# Altium footprint library PCBLIB.PcbLib: 775 footprints (part 37 of 49)
Each footprint in its own frame and in the unit in brackets; x right, y up, seen from the top. Pads: shape width x height; smd on the part's side, far side on the other; paste and mask are expansions set on the pad; w line width, h text height; cw(c..) or ccw(c..) is an arc to the next point about the centre after c.
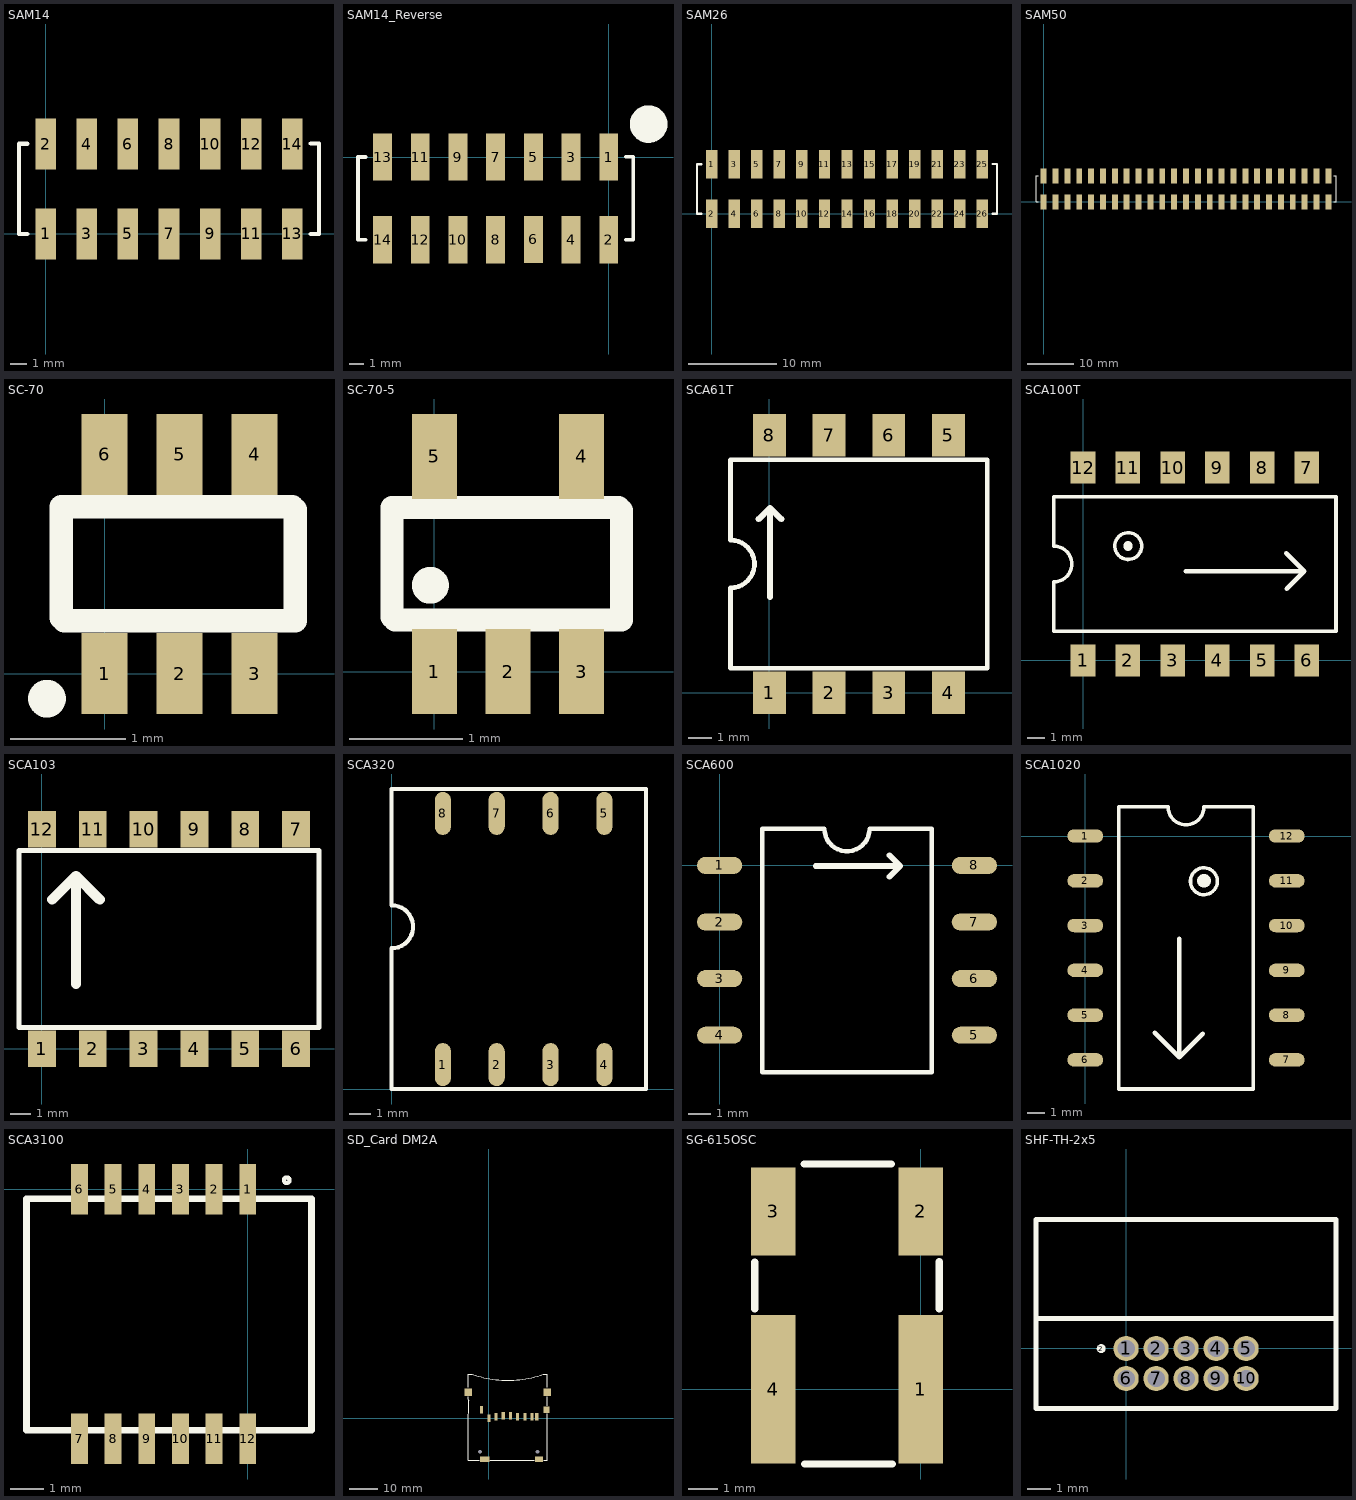
[diagram p36: the footprints below, top view; thin cyan lines are the x and y axes]

## SAM14 [mm]
pads (14):
  rect 1.27x3.17 smd: 1(0,0) 2(0,5.563) 3(2.54,0) 4(2.54,5.563) 5(5.08,0) 6(5.08,5.563) 7(7.62,0) 8(7.62,5.563) 9(10.16,0) 10(10.16,5.563) 11(12.7,0) 12(12.7,5.563) 13(15.24,0) 14(15.24,5.563)
TopOverlay:
  lines w0.254: -1.143,0 -1.651,0 -1.651,5.581 -1.143,5.581 ; 16.383,0.007 16.891,0.007 16.891,5.588 16.383,5.588
  text "." at -1.905,-1.905 h1.78

## SAM14_Reverse [mm]
pads (14):
  rect 1.27x3.17 smd: 1(0,0) 2(0,-5.563) 3(-2.54,0) 4(-2.54,-5.563) 5(-5.08,0) 6(-5.08,-5.537) 7(-7.62,0) 8(-7.62,-5.563) 9(-10.16,0) 10(-10.16,-5.563) 11(-12.7,0) 12(-12.7,-5.563) 13(-15.24,0) 14(-15.24,-5.563)
TopOverlay:
  circle w1.27: c2.684,2.229 r0.633
  lines w0.254: -16.383,-5.563 -16.891,-5.563 -16.891,0.018 -16.383,0.018 ; 1.143,-5.556 1.651,-5.556 1.651,0.025 1.143,0.025

## SAM26 [mm]
pads (26):
  rect 1.27x3.17 smd: 1(0,5.563) 2(0,0) 3(2.54,5.563) 4(2.54,0) 5(5.08,5.563) 6(5.08,0) 7(7.62,5.563) 8(7.62,0) 9(10.16,5.563) 10(10.16,0) 11(12.7,5.563) 12(12.7,0) 13(15.24,5.563) 14(15.24,0) 15(17.78,5.563) 16(17.78,0) 17(20.32,5.563) 18(20.32,0) 19(22.86,5.563) 20(22.86,0) 21(25.4,5.563) 22(25.4,0) 23(27.94,5.563) 24(27.94,0) 25(30.48,5.563) 26(30.48,0)
TopOverlay:
  lines w0.254: -1.143,0 -1.651,0 -1.651,5.581 -1.143,5.581 ; 31.623,0.007 32.131,0.007 32.131,5.588 31.623,5.588
  text "." at -0.229,7.798 h1.78

## SAM50 [mm]
pads (50):
  rect 1.27x3.17 smd: 1(0,0) 2(0,5.563) 3(2.54,0) 4(2.54,5.563) 5(5.08,0) 6(5.08,5.563) 7(7.62,0) 8(7.62,5.563) 9(10.16,0) 10(10.16,5.563) 11(12.7,0) 12(12.7,5.563) 13(15.24,0) 14(15.24,5.563) 15(17.78,0) 16(17.78,5.563) 17(20.32,0) 18(20.32,5.563) 19(22.86,0) 20(22.86,5.563) 21(25.4,0) 22(25.4,5.563) 23(27.94,0) 24(27.94,5.563) 25(30.48,0) 26(30.48,5.563) 27(33.02,0) 28(33.02,5.563) 29(35.56,0) 30(35.56,5.563) 31(38.1,0) 32(38.1,5.563) 33(40.64,0) 34(40.64,5.563) 35(43.18,0) 36(43.18,5.563) 37(45.72,0) 38(45.72,5.563) 39(48.26,0) 40(48.26,5.563) 41(50.8,0) 42(50.8,5.563) 43(53.34,0) 44(53.34,5.563) 45(55.88,0) 46(55.88,5.563) 47(58.42,0) 48(58.42,5.563) 49(60.96,0) 50(60.96,5.563)
TopOverlay:
  lines w0.254: -1.143,0 -1.651,0 -1.651,5.581 -1.143,5.581 ; 62.103,0.007 62.611,0.007 62.611,5.588 62.103,5.588
  text "." at -1.905,-1.905 h1.78

## SC-70 [mm]
pads (6):
  rect 0.4x0.7 smd: 1(0,0) 2(0.65,0) 3(1.3,0) 4(1.3,1.9) 5(0.65,1.9) 6(0,1.9)
TopOverlay:
  circle w0.254: c-0.5,-0.217 r0.036
  lines w0.203: -0.374,0.483 -0.374,1.448 1.626,1.448 ; -0.349,0.457 1.651,0.457 1.651,1.422
Mechanical4:
  text ".040" at 0,0 h0.03

## SC-70-5 [mm]
pads (5):
  rect 0.4x0.75 smd: 1(0,0) 2(0.65,0) 3(1.3,0) 4(1.3,1.9) 5(0,1.9)
TopOverlay:
  circle w0.254: c-0.036,0.762 r0.036
  lines w0.203: -0.374,0.483 -0.374,1.448 1.626,1.448 ; -0.349,0.457 1.651,0.457 1.651,1.422
Mechanical4:
  text ".040" at 0,0 h0.03

## SCA61T [mil]
height 200
pads (8):
  rect 55x71.5 smd: 1(0,0) 2(100,0) 3(200,0) 4(300,0) 5(300,431) 6(200,431) 7(100,431) 8(0,431)
TopOverlay:
  lines w8: -65,41 -65,175.5 ccw(c-65,215.5) -65,255.5 -65,390 365,390 365,41 -65,41
  lines w10: -18,290.5 1,309.5 ; 1,160.5 1,309.5 ; 20,290.5 1,309.5
  text "." at -40,90.5 h75

## SCA100T [mil]
height 200
pads (12):
  rect 55x71.5 smd: 1(0,0) 2(100,0) 3(200,0) 4(300,0) 5(400,0) 6(500,0) 7(500,431) 8(400,431) 9(300,431) 10(200,431) 11(100,431) 12(0,431)
TopOverlay:
  lines w8: 97.03,225.76 cw(c101,255.5) 99.5,225.54 ; -65,65.5 -65,175.5 ccw(c-65,215.5) -65,255.5 -65,365.5 565,365.5 565,65.5 -65,65.5
  lines w10: 231,199.5 229,199.5 494,199.5 ; 454,239.5 493,200.5 ; 454.91,160.41 493.91,199.41
  lines w20: 100,254.5 100,256.5
  text "." at -40,90.5 h75

## SCA103 [mm] "VTI Tech (accelerometer)"
height 5.08
pads (12):
  rect 1.39x1.81 smd: 1(0,0) 2(2.54,0) 3(5.08,0) 4(7.62,0) 5(10.16,0) 6(12.7,0) 7(12.7,10.96) 8(10.16,10.96) 9(7.62,10.96) 10(5.08,10.96) 11(2.54,10.96) 12(0,10.96)
TopOverlay:
  lines w0.254: -1.143,1.067 13.843,1.067 13.843,9.906 -1.143,9.906 -1.143,1.067
  lines w0.5: 0.508,7.442 1.702,8.636 ; 1.702,3.226 1.702,8.636 ; 2.896,7.442 1.702,8.636
  text "." at -0.127,2.413 h1.52

## SCA320 [mil]
pads (8):
  oval 30x80 smd: 1(95.22,45.28) 2(195.22,45.28) 3(295.22,45.28) 4(395.22,45.28) 5(395.22,511.81) 6(295.22,511.81) 7(195.22,511.81) 8(95.22,511.81)
TopOverlay:
  lines w8: 0,0 0,261.18 ccw(c0,301.18) 0,341.18 0,557.09 472.44,557.09 472.44,0 0,0
  text "." at -46.78,18.28 h75

## SCA600 [mil]
height 215
pads (8):
  oval 80x30 smd: 1(0,0) 2(0,-100) 3(0,-200) 4(0,-300) 5(450,-300) 6(450,-200) 7(450,-100) 8(450,0)
TopOverlay:
  lines w8: 75,-365 375,-365 375,65 265,65 cw(c225,65) 185,65 75,65 75,-365
  lines w10: 170,-1 319,-1 ; 300,-20 319,-1 ; 300,18 319,-1
  text "." at 100,40 h75

## SCA1020 [mil]
height 215
pads (12):
  oval 80x30 smd: 1(0,0) 2(0,-100) 3(0,-200) 4(0,-300) 5(0,-400) 6(0,-500) 7(450,-500) 8(450,-400) 9(450,-300) 10(450,-200) 11(450,-100) 12(450,0)
TopOverlay:
  circle w8: c265,-101 r30
  circle w30: c265.14,-100.05 r0.39
  lines w8: 75,-565 375,-565 375,65 265,65 cw(c225,65) 185,65 75,65 75,-565
  lines w10: 155.19,-439.19 210,-494 ; 210,-229 210,-494 ; 262.19,-441.81 210,-494
  text "." at 100,40 h75

## SCA3100 [mil]
pads (12):
  rect 20x60 smd: 1(0,0) 2(-40,-0.15) 3(-80,0) 4(-120,0) 5(-160,0) 6(-200,0) 7(-200,-296.56) 8(-160,-296.56) 9(-120,-296.56) 10(-80,-296.56) 11(-40,-296.56) 12(0,-296.56)
TopOverlay:
  circle w5: c46.37,10.76 r3.35
  lines w8: 75.71,-249.93 75.7,-249.92 ; -262.8,-286.38 -262.8,-11.28 75.7,-11.28 75.7,-286.38 -262.8,-286.38

## SD_Card DM2A [mm]
height 2.2
pads (16):
  rect 1.1x2.6 smd: 1(0,0) 2(2.5,0.5) 3(5,0.8) 4(7.5,0.8) 5(10,0.5) 6(12.5,0.5) 7(15,0.5) 8(16.625,0.5) 9(-2.5,2.9)
  rect 3.3x1.9 smd: 10(-1.489,-14.256)
  rect 2.8x1.9 smd: 11(17.425,-14.25)
  rect 1.96x2.3 smd: 12(20.005,2.95)
  round 0.1 hole 1.36 unplated: MH(-3.125,-11.65) MH(16.875,-11.65)
  rect 2.6x2.6 smd: ""(-7.175,9.01) ""(20.325,9.01)
TopOverlay:
  lines w0.203: -7.228,7.436 -7.228,6.499 -6.935,6.206 -6.935,1.697 -7.228,1.405 -7.228,-14.64 -3.363,-14.64 ; -7.228,10.657 -7.228,15.25 ; 0.326,-14.64 15.727,-14.64 ; 18.901,15.214 cw(c6.65,50.71) -5.705,15.25 ; 18.938,15.25 20.294,15.25 20.294,10.774 ; 19.065,-14.64 20.294,-14.64 20.294,1.595 ; 20.294,4.391 20.294,7.436 ; -7.228,15.25 -5.705,15.25 ; -7.228,15.25 -5.705,15.25

## SG-615OSC [mil]
height 185
pads (4):
  rect 60x200.79 smd: 1(0,0) 4(-200,0)
  rect 60x119 smd: 2(0,240.84) 3(-200,240.84)
TopOverlay:
  lines w10: -225,109 -225,172 ; -158,305 -40,305 ; -157,-101 -39,-101 ; 25,109 25,173
  text "." at 40,-7 h50

## SHF-TH-2x5 [mil]
pads (11):
  round 42 hole 29: 1(0,0) 2(50,0) 3(100,0) 4(150,0) 5(200,0) 6(0,-50) 7(50,-50) 8(100,-50) 9(150,-50) 10(200,-50)
  round 15 on Top Overlay: 2(-41.55,-0.15)
TopOverlay:
  lines w8: -150.24,49.99 -150.24,-100 99.77,-100 349.76,-100 349.76,49.99 ; -150.24,49.99 -150.24,215 99.77,215 349.76,215 349.76,49.99 ; -150.24,49.99 99.77,49.99 349.76,49.99